# Altium footprint library 5.12-直插元件.PcbLib: 165 footprints (part 9 of 11)
Each footprint in its own frame and in the unit in brackets; x right, y up, seen from the top. Pads: shape width x height; smd on the part's side, far side on the other; paste and mask are expansions set on the pad; w line width, h text height; cw(c..) or ccw(c..) is an arc to the next point about the centre after c.
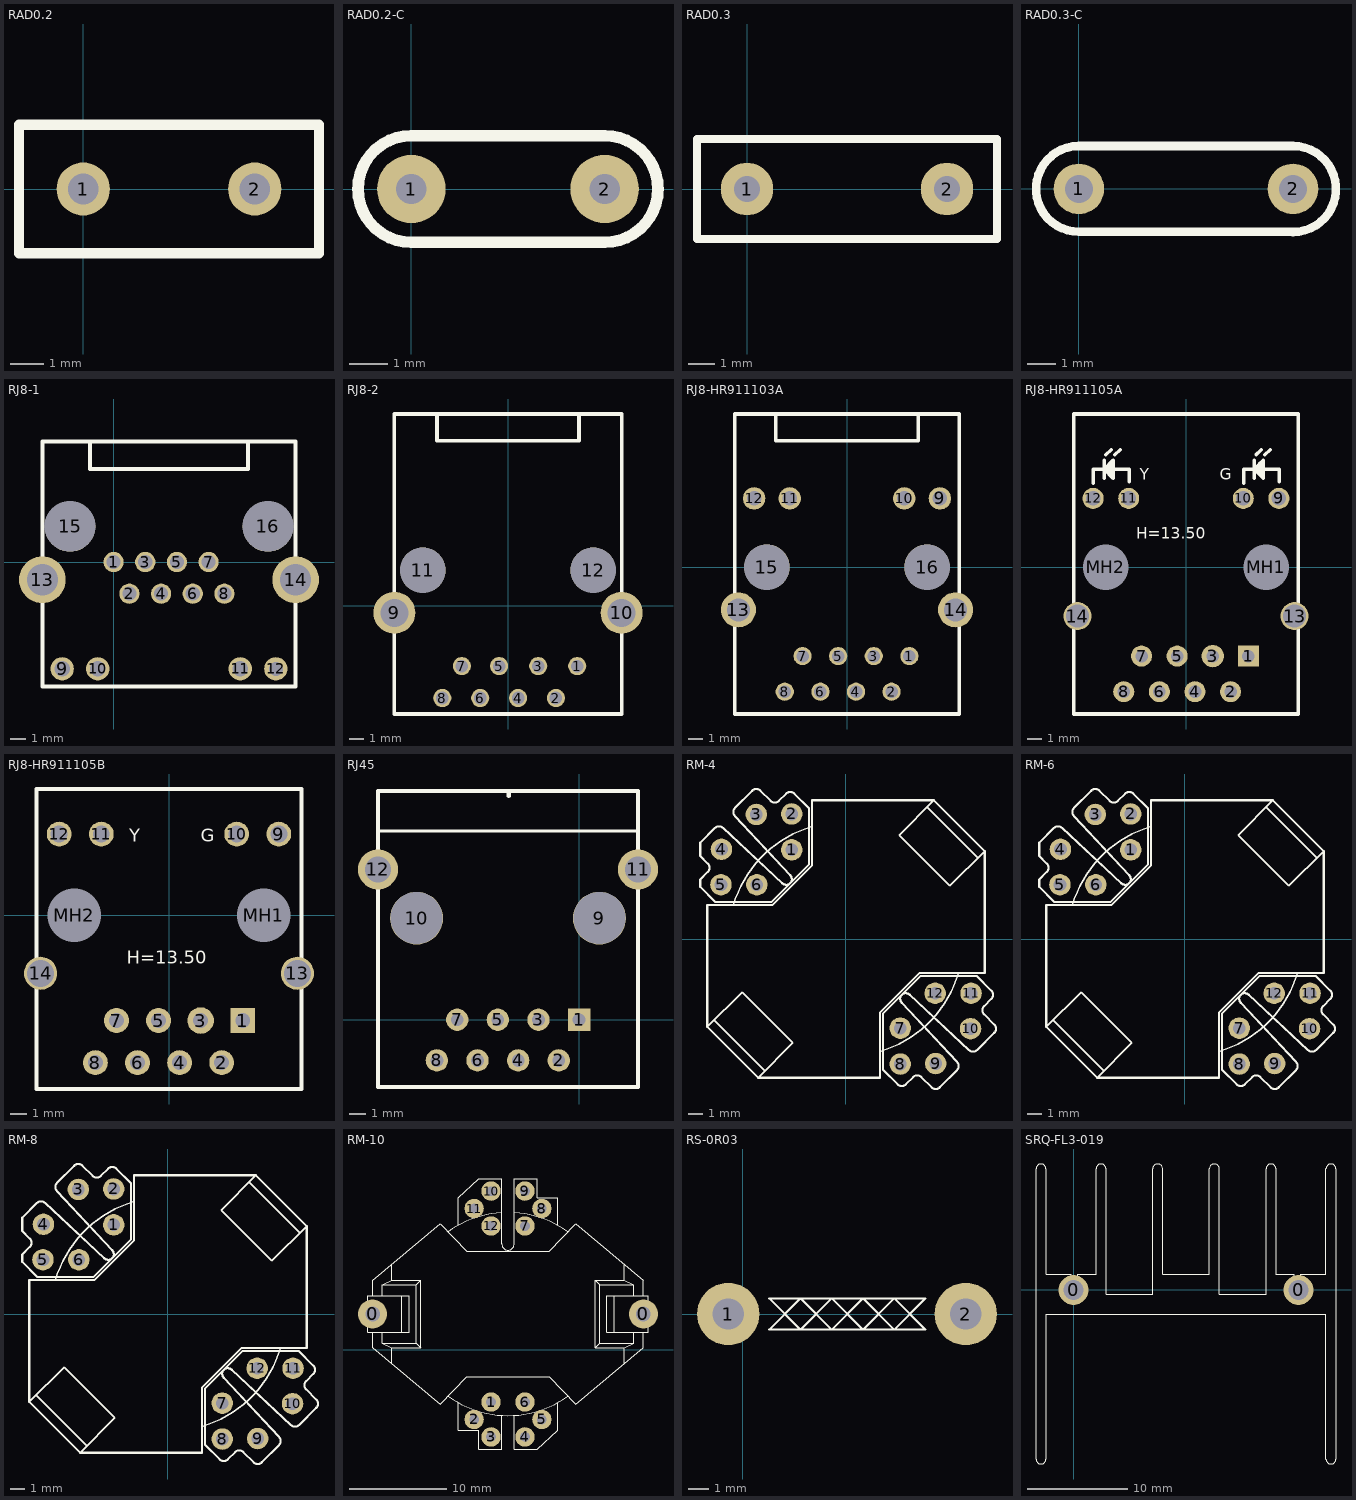
[diagram p8: the footprints below, top view; thin cyan lines are the x and y axes]

## RAD0.2 [mil] "[ PCBѧϰȺ514746572 ]"
pads (2):
  round 62 hole 36: 1(0,0) 2(200,0)
Top Overlay:
  lines w12: -75,-75 275,-75 275,75 -75,75 -75,-75

## RAD0.2-C [mm] "[ PCBѧϰȺ514746572 ]"
pads (2):
  round 1.8 hole 0.8: 1(0,0) 2(5.08,0)
Top Overlay:
  lines w0.305: 0,-1.403 cw(c0,0) 0,1.403 5.08,1.403 cw(c5.08,0) 5.08,-1.403 0,-1.403

## RAD0.3 [mm] "[ PCBѧϰȺ514746572 ]"
pads (2):
  round 2 hole 1: 1(0,0) 2(7.62,0)
Top Overlay:
  lines w0.305: -1.905,-1.905 -1.905,1.905 9.525,1.905 9.525,-1.905 -1.905,-1.905

## RAD0.3-C [mm] "[ PCBѧϰȺ514746572 ]"
pads (2):
  round 1.8 hole 1: 1(0,0) 2(7.62,0)
Top Overlay:
  lines w0.305: 7.62,-1.536 ccw(c7.62,-0.006) 7.62,1.524 0,1.524 ccw(c0,0) 0,-1.524 7.62,-1.524

## RJ8-1 [mm] "网络      [ PCB学习群514746572 ]"
pads (16):
  round 1.3 hole 0.9: 1(0,0) 2(1.016,-2.032) 3(2.032,0) 4(3.048,-2.032) 5(4.064,0) 6(5.08,-2.032) 7(6.096,0) 8(7.112,-2.032)
  round 1.5 hole 1: 9(-3.302,-6.858) 10(-1.016,-6.858) 11(8.128,-6.858)
  round 1.5 hole 0.9: 12(10.414,-6.858)
  round 3 hole 2: 13(-4.572,-1.143) 14(11.684,-1.143)
  round 3.251 hole 3.251: 15(-2.794,2.286) 16(9.906,2.286)
Top Overlay:
  lines w0.254: -1.524,7.747 -1.524,5.969 8.636,5.969 8.636,7.747 ; -4.572,-8.001 -4.572,-1.143 -4.572,7.747 11.684,7.747 11.684,-1.143 11.684,-8.001 -4.572,-8.001

## RJ8-2 [mm] "网络      [ PCB学习群514746572 ]"
height 10
pads (12):
  round 1.3 hole 0.9: 1(4.953,-4.318) 2(3.429,-6.604) 3(2.159,-4.318) 4(0.72,-6.604) 5(-0.635,-4.318) 6(-1.99,-6.604) 7(-3.302,-4.318) 8(-4.699,-6.604)
  round 3 hole 2: 9(-8.128,-0.508) 10(8.128,-0.508)
  round 3.251 hole 3.251: 11(-6.096,2.54) 12(6.096,2.54)
Top Overlay:
  lines w0.254: -5.08,13.589 -5.08,11.811 5.08,11.811 5.08,13.589 ; -8.128,-7.747 -8.128,-0.889 -8.128,13.716 8.128,13.716 8.128,-0.889 8.128,-7.747 -8.128,-7.747

## RJ8-HR911103A [mm] "网络      [ PCB学习群514746572 ]"
height 10
pads (16):
  round 1.3 hole 0.9: 1(4.45,-6.35) 2(3.18,-8.89) 3(1.91,-6.35) 4(0.64,-8.89) 5(-0.63,-6.35) 6(-1.9,-8.89) 7(-3.17,-6.35) 8(-4.44,-8.89)
  round 1.6 hole 1.02: 9(6.625,4.9) 10(4.085,4.9) 11(-4.085,4.9) 12(-6.625,4.9)
  round 2.5 hole 1.63: 13(-7.745,-3.05) 14(7.745,-3.05)
  round 3.251 hole 3.251: 15(-5.715,0) 16(5.715,0)
Top Overlay:
  lines w0.254: -5.08,10.795 -5.08,9.017 5.08,9.017 5.08,10.795 ; -8,-10.48 8,-10.48 8,10.92 -8,10.92 -8,-10.48

## RJ8-HR911105A [mm] "[ PCBѧϰȺ514746572 ]"
height 14.8
pads (16):
  rect 1.5x1.5 hole 0.9: 1(4.45,-6.35)
  round 1.5 hole 0.9: 2(3.18,-8.89) 4(0.64,-8.89) 5(-0.63,-6.35) 6(-1.9,-8.89) 7(-3.17,-6.35) 8(-4.44,-8.89)
  round 1.6 hole 0.9: 3(1.91,-6.35)
  round 1.5 hole 1.02: 9(6.625,4.9) 10(4.085,4.9) 11(-4.085,4.9) 12(-6.625,4.9)
  round 2 hole 1.63: 13(7.745,-3.5) 14(-7.745,-3.5)
  round 2.95 hole 3.25 unplated: MH1(5.715,0) MH2(-5.715,0)
Top Overlay:
  lines w0.25: -6.604,5.969 -6.604,6.985 -4.064,6.985 -4.064,6.096 ; -5.842,6.35 -5.842,7.62 ; -5.715,8.001 -5.334,8.382 ; -5.434,6.592 -5.434,7.393 ; -5.08,8.001 -4.699,8.382 ; 4.106,5.969 4.106,6.985 6.646,6.985 6.646,6.096 ; 4.868,6.35 4.868,7.62 ; 4.995,8.001 5.376,8.382 ; 5.276,6.592 5.276,7.393 ; 5.63,8.001 6.011,8.382 ; -8,-10.48 8,-10.48 8,10.92 -8,10.92 -8,-10.48 ; -5.842,6.985 -5.207,6.35 -5.207,7.62 -5.842,6.985 ; 4.868,6.985 5.503,6.35 5.503,7.62 4.868,6.985
  text "H=13.50" at -3.556,2.032 h0.8
  text "Y" at -3.302,6.223 h0.8
  text "G" at 2.413,6.223 h0.8

## RJ8-HR911105B [mm] "[ PCBѧϰȺ514746572 ]"
height 14.8
pads (16):
  rect 1.5x1.5 hole 0.9: 1(4.45,-6.35)
  round 1.5 hole 0.9: 2(3.18,-8.89) 4(0.64,-8.89) 5(-0.63,-6.35) 6(-1.9,-8.89) 7(-3.17,-6.35) 8(-4.44,-8.89)
  round 1.6 hole 0.9: 3(1.91,-6.35)
  round 1.5 hole 1.02: 9(6.625,4.9) 10(4.085,4.9) 11(-4.085,4.9) 12(-6.625,4.9)
  round 2 hole 1.63: 13(7.745,-3.5) 14(-7.745,-3.5)
  round 2.95 hole 3.25 unplated: MH1(5.715,0) MH2(-5.715,0)
Top Overlay:
  lines w0.25: -8,-10.48 -8,7.62 8,7.62 8,-10.48 -8,-10.48
  text "G" at 1.905,4.445 h0.8
  text "Y" at -2.413,4.445 h0.8
  text "H=13.50" at -2.54,-2.921 h0.8

## RJ45 [mil] "[ PCBѧϰȺ514746572 ]"
pads (12):
  rect 55x55 hole 31.5: 1(0,0)
  round 55 hole 31.5: 2(-50,-100) 3(-100,0) 4(-150,-100) 5(-200,0) 6(-250,-100) 7(-300,0) 8(-350,-100)
  round 130 hole 127.95 unplated: 9(50,250) 10(-400,250)
  round 98.42 hole 62.99: 11(145,370) 12(-495,370)
Top Overlay:
  lines w8: -488.19,464.57 141.73,464.57
  lines w10: -495,-165.35 144.65,-165.35 145,-165 145,370 145,562.99 -495,562.99 -495,370 -495,-165 ; -173.23,551.18 -173.23,559.06
3D body "Mod-Jack-K122449007-Stig-W.STEP": height 127.85, standoff -555.12, extent -490,-172.17 139.92,556.17

## RM-4 [mil] "[ PCBѧϰȺ514746572 ]"
pads (12):
  round 60 hole 35.43: 1(-151.72,249.16) 2(-151.72,349.38) 3(-250.55,347.99) 4(-347.99,250.55) 5(-349.38,151.72) 6(-249.16,151.72) 7(151.72,-249.16) 8(151.72,-349.38) 9(250.55,-347.99) 10(347.99,-250.55) 11(349.38,-151.72) 12(249.16,-151.72)
Top Overlay:
  lines w3.94: -387.66,-245.68 -290.22,-148.24 -148.24,-290.22 -245.68,-387.66 ; -368.59,-226.61 -226.61,-368.59 ; -314.81,94.69 cw(c0,0) -94.74,314.79 ; 94.69,-314.81 ccw(c0,0) 314.79,-94.73 ; 226.61,368.59 368.59,226.61 ; 245.68,387.66 148.24,290.22 290.22,148.24 387.66,245.68
  lines w5.91: -407.35,145.67 -364.69,103 -208.79,103 -103,208.79 ; -407.35,146.42 -407.34,166.14 -385.93,187.55 ccw(c-397.37,198.99) -385.93,210.43 -407.34,231.84 ; -407.34,231.96 -407.34,269.03 -366.33,310.04 cw(c-354.89,298.6) -343.45,310.04 ; -343.1,310.41 -178.4,155.77 ; -310.41,343.1 -155.77,178.4 ; -310.1,366.39 -262.05,414.44 cw(c-250.61,403) -239.16,414.44 -210.66,385.93 ; -310.04,343.45 cw(c-298.6,354.89) -310.04,366.33 ; -210.43,385.93 ccw(c-198.99,397.37) -187.55,385.93 -167.4,406.09 cw(c-155.95,394.64) -144.51,406.09 -103.37,364.94 ccw(c-103.31,365) -103.25,364.94 -103.25,208.93 ; -178.22,155.95 ccw(c-167.09,167.09) -155.95,178.22 ; 103,-364.69 103,-208.79 208.79,-103 ; 103.37,-364.94 144.51,-406.09 ccw(c155.95,-394.64) 167.39,-406.09 187.55,-385.93 cw(c198.99,-397.37) 210.43,-385.93 ; 155.77,-178.4 310.41,-343.1 ; 155.95,-178.22 cw(c167.09,-167.09) 178.22,-155.95 ; 178.4,-155.77 343.1,-310.41 ; 208.93,-103.25 364.94,-103.25 ; 210.66,-385.93 239.16,-414.44 ccw(c250.61,-403) 262.05,-414.44 310.1,-366.39 ; 310.04,-366.33 ccw(c298.6,-354.89) 310.04,-343.45 ; 343.45,-310.04 ccw(c354.89,-298.6) 366.33,-310.04 ; 364.94,-103.37 406.09,-144.51 cw(c394.64,-155.95) 406.09,-167.39 385.93,-187.55 ccw(c397.37,-198.99) 385.93,-210.43 ; 366.39,-310.1 414.44,-262.05 ccw(c403,-250.61) 414.44,-239.16 385.93,-210.66 ; -387.66,-245.68 -245.68,-387.66 94.65,-387.66 94.65,-206.01 206.01,-94.65 387.66,-94.65 387.66,245.68 245.68,387.66 -94.65,387.66 -94.65,206.01 -206.01,94.65 -387.66,94.65 -387.66,-245.68
3D body "rm8.STEP": height 647.05, standoff -116.73, extent -417.83,-417.83 417.83,417.83

## RM-6 [mil] "[ PCBѧϰȺ514746572 ]"
pads (12):
  round 60 hole 35.43: 1(-151.72,249.16) 2(-151.72,349.38) 3(-250.55,347.99) 4(-347.99,250.55) 5(-349.38,151.72) 6(-249.16,151.72) 7(151.72,-249.16) 8(151.72,-349.38) 9(250.55,-347.99) 10(347.99,-250.55) 11(349.38,-151.72) 12(249.16,-151.72)
Top Overlay:
  lines w3.94: -387.66,-245.68 -290.22,-148.24 -148.24,-290.22 -245.68,-387.66 ; -368.59,-226.61 -226.61,-368.59 ; -314.81,94.69 cw(c0,0) -94.74,314.79 ; 94.69,-314.81 ccw(c0,0) 314.79,-94.73 ; 226.61,368.59 368.59,226.61 ; 245.68,387.66 148.24,290.22 290.22,148.24 387.66,245.68
  lines w5.91: -407.35,145.67 -364.69,103 -208.79,103 -103,208.79 ; -407.35,146.42 -407.34,166.14 -385.93,187.55 ccw(c-397.37,198.99) -385.93,210.43 -407.34,231.84 ; -407.34,231.96 -407.34,269.03 -366.33,310.04 cw(c-354.89,298.6) -343.45,310.04 ; -343.1,310.41 -178.4,155.77 ; -310.41,343.1 -155.77,178.4 ; -310.1,366.39 -262.05,414.44 cw(c-250.61,403) -239.16,414.44 -210.66,385.93 ; -310.04,343.45 cw(c-298.6,354.89) -310.04,366.33 ; -210.43,385.93 ccw(c-198.99,397.37) -187.55,385.93 -167.4,406.09 cw(c-155.95,394.64) -144.51,406.09 -103.37,364.94 ccw(c-103.31,365) -103.25,364.94 -103.25,208.93 ; -178.22,155.95 ccw(c-167.09,167.09) -155.95,178.22 ; 103,-364.69 103,-208.79 208.79,-103 ; 103.37,-364.94 144.51,-406.09 ccw(c155.95,-394.64) 167.39,-406.09 187.55,-385.93 cw(c198.99,-397.37) 210.43,-385.93 ; 155.77,-178.4 310.41,-343.1 ; 155.95,-178.22 cw(c167.09,-167.09) 178.22,-155.95 ; 178.4,-155.77 343.1,-310.41 ; 208.93,-103.25 364.94,-103.25 ; 210.66,-385.93 239.16,-414.44 ccw(c250.61,-403) 262.05,-414.44 310.1,-366.39 ; 310.04,-366.33 ccw(c298.6,-354.89) 310.04,-343.45 ; 343.45,-310.04 ccw(c354.89,-298.6) 366.33,-310.04 ; 364.94,-103.37 406.09,-144.51 cw(c394.64,-155.95) 406.09,-167.39 385.93,-187.55 ccw(c397.37,-198.99) 385.93,-210.43 ; 366.39,-310.1 414.44,-262.05 ccw(c403,-250.61) 414.44,-239.16 385.93,-210.66 ; -387.66,-245.68 -387.66,94.65 -206.01,94.65 -94.65,206.01 -94.65,387.66 245.68,387.66 387.66,245.68 387.66,-94.65 206.01,-94.65 94.65,-206.01 94.65,-387.66 -245.68,-387.66 -387.66,-245.68
3D body "rm8.STEP": height 647.05, standoff -116.73, extent -417.83,-417.83 417.83,417.83

## RM-8 [mil] "[ PCBѧϰȺ514746572 ]"
pads (12):
  round 60 hole 35.43: 1(-151.72,249.16) 2(-151.72,349.38) 3(-250.55,347.99) 4(-347.99,250.55) 5(-349.38,151.72) 6(-249.16,151.72) 7(151.72,-249.16) 8(151.72,-349.38) 9(250.55,-347.99) 10(347.99,-250.55) 11(349.38,-151.72) 12(249.16,-151.72)
Top Overlay:
  lines w3.94: -387.66,-245.68 -290.22,-148.24 -148.24,-290.22 -245.68,-387.66 ; -368.59,-226.61 -226.61,-368.59 ; -314.81,94.69 cw(c0,0) -94.74,314.79 ; 94.69,-314.81 ccw(c0,0) 314.79,-94.73 ; 226.61,368.59 368.59,226.61 ; 245.68,387.66 148.24,290.22 290.22,148.24 387.66,245.68
  lines w5.91: -407.35,145.67 -364.69,103 -208.79,103 -103,208.79 ; -407.35,146.42 -407.34,166.14 -385.93,187.55 ccw(c-397.37,198.99) -385.93,210.43 -407.34,231.84 ; -407.34,231.96 -407.34,269.03 -366.33,310.04 cw(c-354.89,298.6) -343.45,310.04 ; -343.1,310.41 -178.4,155.77 ; -310.41,343.1 -155.77,178.4 ; -310.1,366.39 -262.05,414.44 cw(c-250.61,403) -239.16,414.44 -210.66,385.93 ; -310.04,343.45 cw(c-298.6,354.89) -310.04,366.33 ; -210.43,385.93 ccw(c-198.99,397.37) -187.55,385.93 -167.4,406.09 cw(c-155.95,394.64) -144.51,406.09 -103.37,364.94 ccw(c-103.31,365) -103.25,364.94 -103.25,208.93 ; -178.22,155.95 ccw(c-167.09,167.09) -155.95,178.22 ; 103,-364.69 103,-208.79 208.79,-103 ; 103.37,-364.94 144.51,-406.09 ccw(c155.95,-394.64) 167.39,-406.09 187.55,-385.93 cw(c198.99,-397.37) 210.43,-385.93 ; 155.77,-178.4 310.41,-343.1 ; 155.95,-178.22 cw(c167.09,-167.09) 178.22,-155.95 ; 178.4,-155.77 343.1,-310.41 ; 208.93,-103.25 364.94,-103.25 ; 210.66,-385.93 239.16,-414.44 ccw(c250.61,-403) 262.05,-414.44 310.1,-366.39 ; 310.04,-366.33 ccw(c298.6,-354.89) 310.04,-343.45 ; 343.45,-310.04 ccw(c354.89,-298.6) 366.33,-310.04 ; 364.94,-103.37 406.09,-144.51 cw(c394.64,-155.95) 406.09,-167.39 385.93,-187.55 ccw(c397.37,-198.99) 385.93,-210.43 ; 366.39,-310.1 414.44,-262.05 ccw(c403,-250.61) 414.44,-239.16 385.93,-210.66 ; -387.66,-245.68 -387.66,94.65 -206.01,94.65 -94.65,206.01 -94.65,387.66 245.68,387.66 387.66,245.68 387.66,-94.65 206.01,-94.65 94.65,-206.01 94.65,-387.66 -245.68,-387.66 -387.66,-245.68
3D body "rm8.STEP": height 647.05, standoff -116.73, extent -417.83,-417.83 417.83,417.83

## RM-10 [mm] "[ PCBѧϰȺ514746572 ]"
pads (14):
  round 3 hole 1.5: 0(12.044,3.671) 0(40.044,3.671)
  round 2 hole 1: 1(24.294,-5.429) 2(22.544,-7.229) 3(24.294,-9.029) 4(27.794,-9.029) 5(29.544,-7.229) 6(27.794,-5.429) 7(27.794,12.771) 8(29.544,14.571) 9(27.794,16.371) 10(24.294,16.371) 11(22.544,14.571) 12(24.294,12.771)
Top Overlay:
  lines w0.1: 12.044,1.754 12.044,0.171 19.044,-5.679 21.794,-2.829 30.294,-2.829 33.044,-5.679 40.044,0.171 40.044,1.754 ; 12.044,5.575 12.044,7.171 19.044,13.021 21.794,10.171 30.294,10.171 33.044,13.021 40.044,7.171 40.044,5.575 ; 13.044,1.754 13.044,0.671 ; 13.044,5.576 13.044,6.671 ; 14.044,-1.481 14.044,0.171 ; 14.044,8.837 14.044,7.171 ; 15.044,1.771 15.044,5.571 ; 19.857,12.155 cw(c26.044,3.671) 25.394,14.151 ; 19.871,-4.823 ccw(c26.044,3.671) 32.217,-4.823 ; 20.894,-5.482 20.894,-8.329 23.044,-8.329 23.044,-10.329 25.394,-10.329 25.394,-6.82 ; 20.894,12.831 20.894,15.671 23.044,17.671 25.394,17.671 25.394,10.92 ccw(c26.044,10.92) 26.694,10.92 26.694,17.671 29.044,17.671 29.044,15.671 31.194,15.671 31.194,12.832 ; 26.694,-6.818 26.694,-10.329 29.044,-10.329 31.194,-8.329 31.194,-5.482 ; 26.696,14.151 cw(c26.044,3.671) 32.217,12.165 ; 37.044,1.771 37.044,5.571 ; 38.044,-1.481 38.044,0.171 ; 38.044,8.837 38.044,7.171 ; 39.044,1.754 39.044,0.671 ; 39.044,5.576 39.044,6.671 ; 13.044,0.671 16.544,0.671 ; 13.044,0.671 14.044,0.171 ; 13.044,6.671 16.544,6.671 ; 13.044,6.671 14.044,7.171 ; 14.044,0.171 17.044,0.171 ; 14.044,7.171 17.044,7.171 ; 16.544,0.671 16.544,6.671 ; 16.544,0.671 17.044,0.171 ; 16.544,6.671 17.044,7.171 ; 17.044,0.171 17.044,7.171 ; 35.044,0.171 35.544,0.671 ; 35.044,0.171 38.044,0.171 ; 35.044,0.171 35.044,7.171 ; 35.044,7.171 35.544,6.671 ; 35.044,7.171 38.044,7.171 ; 35.544,0.671 35.544,6.671 ; 35.544,0.671 39.044,0.671 ; 35.544,6.671 39.044,6.671 ; 38.044,0.171 39.044,0.671 ; 38.044,7.171 39.044,6.671 ; 11.544,1.771 11.544,5.571 15.844,5.571 15.844,1.771 11.544,1.771 ; 36.244,1.771 40.544,1.771 40.544,5.571 36.244,5.571 36.244,1.771
3D body: height 13.5, standoff 3, extent 16.083,-6.309 36.005,13.651
3D body "User Library-RM10.STEP": height 16.5, standoff -3.4, extent 11.794,-10.701 40.294,18.043

## RS-0R03 [mm] "[ PCBѧϰȺ514746572 ]"
pads (2):
  round 3 hole 1.5: 1(-0.7,0) 2(10.7,0)
Top Overlay:
  lines w0.1: 1.268,-0.75 8.768,-0.75 7.268,0.75 5.768,-0.75 4.268,0.75 2.768,-0.75 1.268,0.75 8.768,0.75 7.268,-0.75 5.768,0.75 4.268,-0.75 2.768,0.75 1.268,-0.75
3D body "User Library-615HR030E.step": height 6.5, standoff -2, extent -1.6,-1.2 11.6,1.2

## SRQ-FL3-019 [mm] "[ PCBѧϰȺ514746572 ]"
pads (2):
  round 3 hole 2: 0(0,0) 0(22.5,0)
Top Overlay:
  lines w0.1: 20.25,1.592 22.05,1.592 22.05,0.461 ; 20.25,1.6 20.25,12.1 ccw(c19.75,12.1) 19.25,12.1 19.25,-0.4 14.583,-0.4 14.583,12.1 ccw(c14.083,12.1) 13.583,12.1 13.583,1.6 8.917,1.6 8.917,12.1 ccw(c8.417,12.1) 7.917,12.1 7.917,-0.4 3.25,-0.4 3.25,12.1 ccw(c2.75,12.1) 2.25,12.1 2.25,1.6 0.45,1.6 0.45,0.469 cw(c0,0) -0.25,0.6 -0.25,1.6 -2.75,1.6 -2.75,1.61 -2.75,12.1 ccw(c-3.25,12.1) -3.75,12.1 -3.75,-16.9 ccw(c-3.25,-16.9) -2.75,-16.9 -2.75,-2.4 25.25,-2.4 25.25,-16.9 ccw(c25.75,-16.9) 26.25,-16.9 26.25,12.1 ccw(c25.75,12.1) 25.25,12.1 25.25,1.602 ; 22.05,0.461 ccw(c22.5,-0.008) 22.75,0.592 ; 22.75,0.592 22.75,1.592 25.25,1.592 25.25,1.602 ; 25.25,1.6 25.25,1.602
3D body: height 25, standoff 0, extent -3.746,11.601 -2.75,12.599
3D body: height 25, standoff 0, extent 2.254,11.601 3.25,12.599
3D body: height 25, standoff 0, extent 7.921,11.601 8.917,12.599
3D body: height 25, standoff 0, extent 13.587,11.601 14.583,12.599
3D body: height 25, standoff 0, extent 19.254,11.601 20.25,12.599
3D body: height 25, standoff 0, extent 25.254,11.601 26.25,12.599
3D body: height 25, standoff 0, extent 25.254,-17.399 26.25,-16.401
3D body: height 25, standoff 0, extent -3.746,-17.399 -2.75,-16.401
3D body: height 25, standoff 0, extent 2.25,-2.407 20.25,12.1
3D body: height 25, standoff 0, extent 20.25,0.461 22.05,1.592
3D body: height 25, standoff 0, extent 22.75,0.592 25.25,1.592
3D body: height 25, standoff 0, extent 22.51,-2.4 25.25,-0.003
3D body: height 25, standoff 0, extent 20.25,-2.4 22.51,0.005
3D body: height 25, standoff 0, extent 20.25,0.005 22.05,0.461
3D body: height 25, standoff 0, extent 22.75,-0.003 25.25,0.592
3D body: height 25, standoff 0, extent -2.75,0.005 -0.25,0.6
3D body: height 25, standoff 0, extent 0.45,0.013 2.25,0.469
3D body: height 25, standoff 0, extent -0.01,-2.392 2.25,0.013
3D body: height 25, standoff 0, extent -2.75,-2.392 -0.01,0.005
3D body: height 25, standoff 0, extent -2.75,0.6 -0.25,1.6
3D body: height 25, standoff 0, extent 0.45,0.469 2.25,1.6
3D body: height 25, standoff 0, extent -3.746,-16.9 -2.75,12.1
3D body: height 25, standoff 0, extent 25.25,-16.9 26.25,12.1
3D body: height 8, standoff -5, extent -0.744,-0.748 0.75,0.749
3D body: height 8, standoff -5, extent 21.75,-0.757 23.244,0.74